# Altium footprint library Pasivos.PcbLib: 55 footprints (part 2 of 4)
Each footprint in its own frame and in the unit in brackets; x right, y up, seen from the top. Pads: shape width x height; smd on the part's side, far side on the other; paste and mask are expansions set on the pad; w line width, h text height; cw(c..) or ccw(c..) is an arc to the next point about the centre after c.
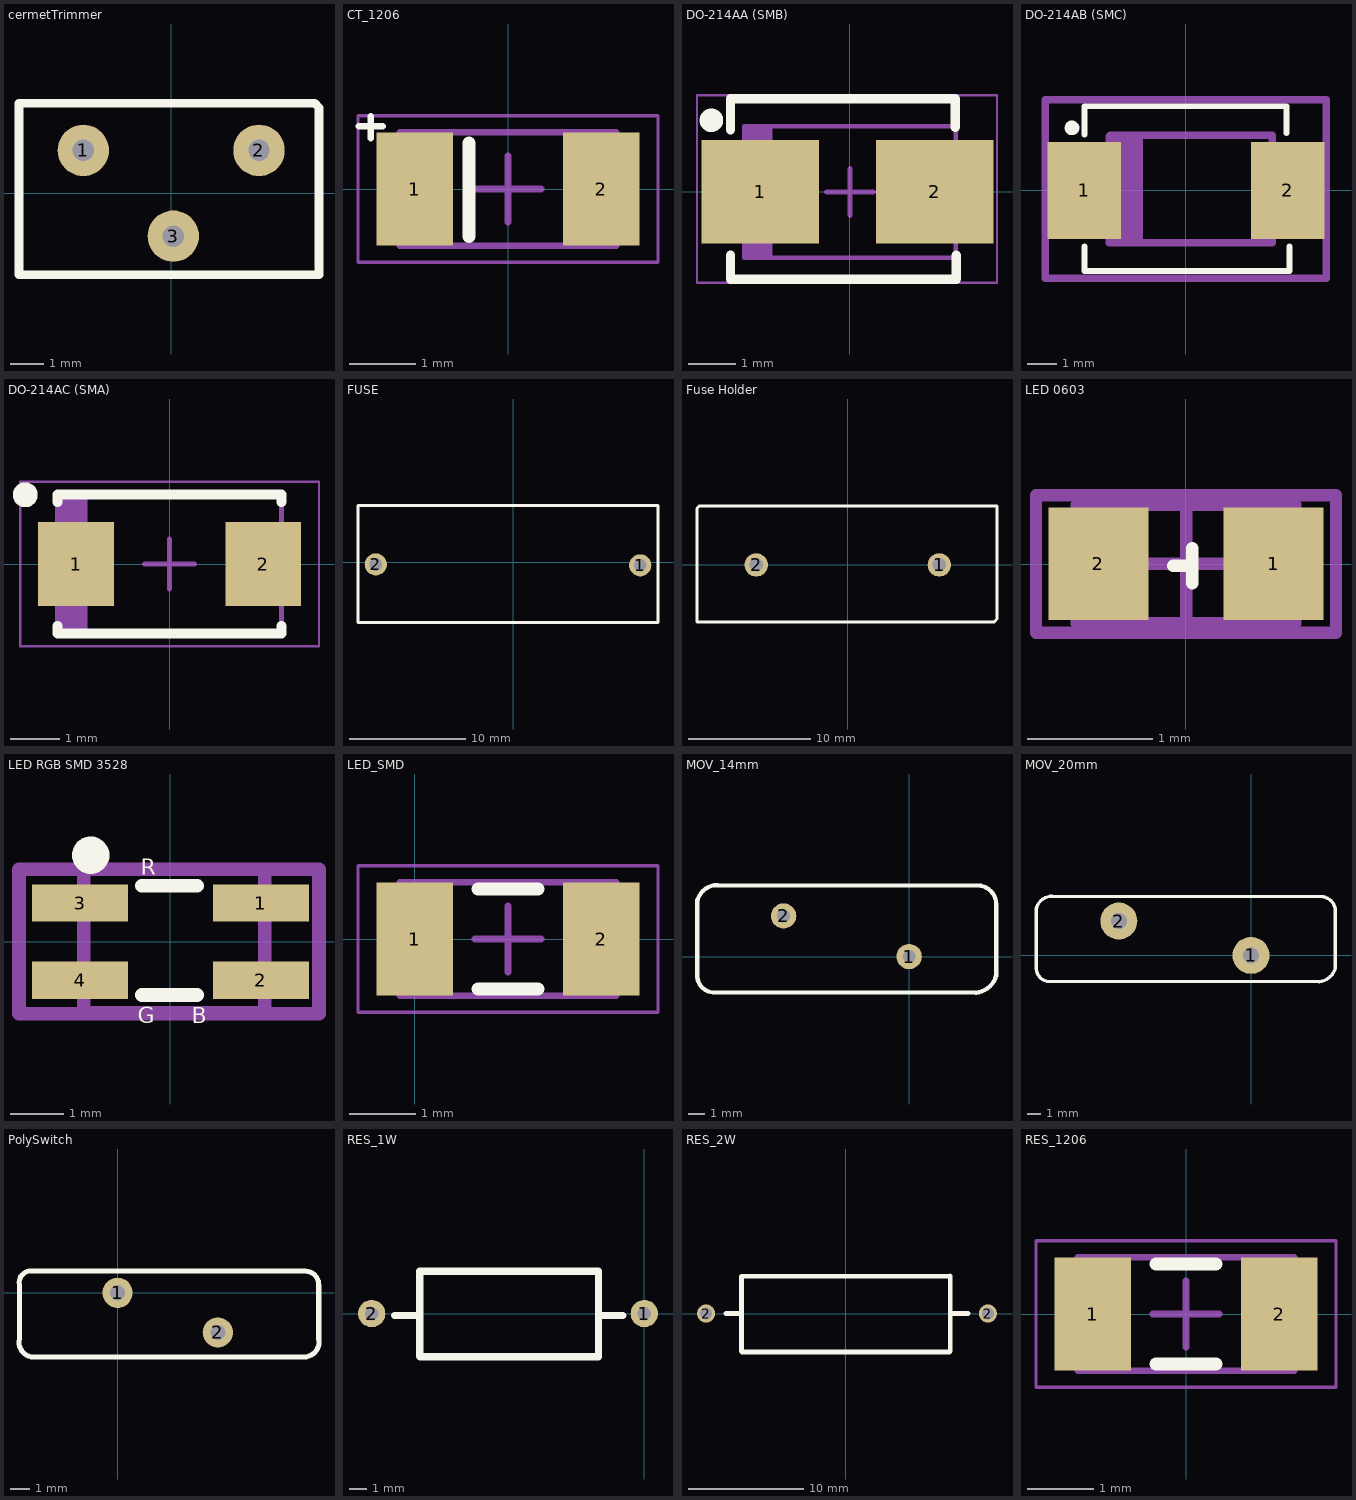
[diagram p1: the footprints below, top view; thin cyan lines are the x and y axes]

## cermetTrimmer [mil] "Bourns 3386H Series Through Hole Cermet Trimmer Resistor with Pin Terminations, 10kO ±10% 1/2W ±100ppm/°C"
pads (3):
  round 60 hole 25: 1(-102.5,50) 2(102.5,50) 3(2.5,-50)
Top Overlay:
  lines w10: -177.5,-95 -177.5,105 167.5,105 172.5,100 172.5,-95 -177.5,-95
3D body: height 380, standoff -231.14, extent -189.5,-90 187.5,105

## CT_1206 [mm] "Tantalum Capacitor 1206 SMD"
height 0.65
pads (2):
  rect 1.15x1.7 smd: 1(-1.4,0) 2(1.4,0)
Top Overlay:
  lines w0.1: -2.235,0.94 -1.88,0.94 ; -2.057,0.762 -2.057,1.092
  lines w0.2: -0.584,-0.711 -0.584,0.686
Mechanical 13:
  lines w0.1: -1.625,-0.85 1.625,-0.85 1.625,0.85 -1.625,0.85 -1.625,-0.85
Mechanical 15:
  lines w0.05: -2.25,-1.1 2.25,-1.1 2.25,1.1 -2.25,1.1 -2.25,-1.1
  lines w0.1: -0.5,0 0.5,0 ; 0,-0.5 0,0.5
3D body: height 1.65, standoff -0.01, extent -1.706,-0.8 1.757,0.8

## DO-214AA (SMB) [mm] "DO-214AA (SMB J-Bend)"
height 2.29
pads (2):
  rect 2.5x2.2 smd: 1(-1.905,0) 2(1.799,0)
Top Overlay:
  circle w0.25: c-2.946,1.524 r0.125
  lines w0.2: -2.54,-1.346 -2.54,-1.854 2.261,-1.854 2.261,-1.346 ; -2.54,1.321 -2.54,1.981 2.235,1.981 2.235,1.372
Mechanical 13:
  rectangle: -2.25,-1.395 -1.645,1.395
  lines w0.1: -2.25,-1.395 -2.25,1.395 2.25,1.395 2.25,-1.395 -2.25,-1.395
Mechanical 15:
  lines w0.05: -3.251,-1.93 -3.251,2.057 3.124,2.057 3.124,-1.93 -3.251,-1.93
  lines w0.1: -0.5,0 0.5,0 ; 0,-0.5 0,0.5
3D body: height 2.6, standoff -0.05, extent -2.921,-1.924 2.667,2.026

## DO-214AB (SMC) [mm] "DO-214AB (SMC) Package"
pads (2):
  rect 2.5x3.3 smd: 1(-3.463,0) 2(3.463,0)
Top Overlay:
  circle w0.25: c-3.886,2.134 r0.125
  lines w0.2: -3.454,-1.905 -3.454,-2.743 3.531,-2.743 3.531,-1.905 ; -3.454,1.905 -3.454,2.87 3.429,2.87 3.429,1.956
Mechanical 13:
  rectangle: -2.616,-1.727 -1.473,1.854
  lines w0.254: -2.616,1.854 -2.616,-1.778 2.946,-1.778 2.946,1.88 -2.591,1.88
Mechanical 15:
  lines w0.254: -4.801,-2.997 4.775,-2.997 4.775,3.099 -4.801,3.099 -4.801,-2.997
3D body: height 2.4, standoff 0.03, extent -4.014,-3.048 4.116,3.052

## DO-214AC (SMA) [mm] "Surface Mount Schottky Barrier Rectifier SS14"
height 2.29
pads (2):
  rect 1.52x1.68 smd: 1(-1.88,0) 2(1.88,0)
Top Overlay:
  circle w0.25: c-2.9,1.39 r0.125
  lines w0.2: -2.25,-1.24 -2.25,-1.4 2.25,-1.4 2.25,-1.24 ; -2.25,1.24 -2.25,1.4 2.25,1.4 2.25,1.24
Mechanical 13:
  rectangle: -2.25,-1.395 -1.645,1.395
  lines w0.1: -2.25,-1.395 2.25,-1.395 2.25,1.395 -2.25,1.395 -2.25,-1.395
Mechanical 15:
  lines w0.05: -3,-1.65 3,-1.65 3,1.65 -3,1.65 -3,-1.65
  lines w0.1: -0.5,0 0.5,0 ; 0,-0.5 0,0.5
3D body: height 2.7, standoff 0, extent -2.825,-1.526 2.775,1.424

## FUSE [mm] "Fuse 5A with Holder 20mm"
pads (2):
  round 1.9 hole 1.1: 1(10.897,-0.254) 2(-11.786,-0.178)
Top Overlay:
  lines w0.254: -13.31,-5.156 12.421,-5.156 12.421,4.877 -13.31,4.877 -13.31,-5.156
3D body: height 13.97, standoff -4.38, extent -12.557,-4.693 11.693,4.307

## Fuse Holder [mm] "PCB Fuse Holder 15mm"
pads (2):
  round 1.924 hole 1.1: 1(7.531,0) 2(-7.531,0)
Top Overlay:
  lines w0.254: -12.395,-4.674 -12.395,4.648 -12.192,4.851 12.268,4.851 12.268,-4.445 12.014,-4.699 -12.37,-4.699
3D body: height 12.5, standoff -3.5, extent -12.237,-4.6 12.163,4.8
3D body: height 12.25, standoff 7.75, extent -9.614,-2.239 9.386,2.261

## LED 0603 [mm] "LED SMD 0603"
height 1.3
pads (2):
  rect 0.8x0.9 smd: 1(0.7,0) 2(-0.7,0)
Top Overlay:
  lines w0.1: -0.102,-0.013 0.051,-0.013 ; 0.051,-0.152 0.051,0.127
Mechanical 13:
  lines w0.1: -0.875,-0.475 0.875,-0.475 0.875,0.475 -0.875,0.475 -0.875,-0.475
Mechanical 15:
  lines w0.1: -0.475,0 0.475,0 ; 0,-0.475 0,0.475 ; -1.2,-0.55 1.2,-0.55 1.2,0.55 -1.2,0.55 -1.2,-0.55
3D body: height 0.68, standoff 0, extent -0.85,-0.344 0.8,0.381

## LED RGB SMD 3528 [mm] "WL-SFTW SMD LED RGB 3528"
pads (4):
  rect 1.8x0.7 smd: 1(1.7,0.725) 2(1.7,-0.725) 3(-1.7,0.725) 4(-1.7,-0.725)
Top Overlay:
  circle w0.5: c-1.499,1.626 r0.1
  lines w0.254: -0.535,-1.002 0.506,-1.002 ; -0.535,1.055 0.506,1.055
  text "G" at -0.611,-1.536 h0.3
  text "R" at -0.561,1.258 h0.3
  text "B" at 0.405,-1.536 h0.3
Mechanical 13:
  lines w0.254: -1.627,-1.332 -1.627,1.284 -1.551,1.36 1.776,1.36 1.776,-1.332 -1.627,-1.332
Mechanical 15:
  lines w0.254: -2.847,-1.358 2.792,-1.358 2.792,1.36 -2.847,1.36 -2.847,-1.358
3D body: height 1.9, standoff 0, extent -1.701,-1.437 1.799,1.363

## LED_SMD [mm] "LED SMD 1206"
pads (2):
  rect 1.15x1.7 smd: 1(0,0) 2(2.8,0)
Top Overlay:
  lines w0.2: 0.95,-0.75 1.85,-0.75 ; 0.95,0.75 1.85,0.75
Mechanical 13:
  lines w0.1: -0.225,-0.85 3.025,-0.85 3.025,0.85 -0.225,0.85 -0.225,-0.85
Mechanical 15:
  lines w0.05: -0.85,-1.1 3.65,-1.1 3.65,1.1 -0.85,1.1 -0.85,-1.1
  lines w0.1: 0.9,0 1.9,0 ; 1.4,-0.5 1.4,0.5
3D body: height 1.1, standoff 0, extent -0.178,-0.787 3.022,0.813

## MOV_14mm [mil] "MOV Varistor Diámetro=14 mm"
pads (2):
  round 60 hole 30: 1(0,0) 2(-297,96)
Top Overlay:
  lines w10: -501,130 cw(c-454.5,121.5) -446,168 ; -501,134 -501,-48 ccw(c-461,-45) -458,-85 163,-85 ; -465,168 163.05,168 ; 158.15,-85.58 ccw(c153,-31) 206,-45 ; 163.05,167.95 cw(c162,124) 205.97,124 ; 206,-46 206,124
3D body: height 787.08, standoff -118.11, extent -481.63,-65 187.63,155.47

## MOV_20mm [mm] "MOV Varistor Diámetro=20 mm"
pads (2):
  round 2.8 hole 1.2: 1(0,0) 2(-10,2.6)
Top Overlay:
  lines w0.254: -16.248,3.489 cw(c-15.067,3.273) -14.851,4.454 ; -16.248,3.591 -16.248,-1.032 ccw(c-15.232,-0.956) -15.156,-1.972 ; -15.309,-1.972 5.189,-1.972 ; -15.207,4.454 5.316,4.454 ; 5.168,-1.987 ccw(c5.037,-0.6) 6.383,-0.956 ; 5.292,4.453 cw(c5.265,3.337) 6.382,3.337 ; 6.383,-0.981 6.383,3.337
3D body: height 24.5, standoff -2.99, extent -15.756,-1.598 5.744,4.2

## PolySwitch [mil] "PolySwitch"
pads (2):
  round 60 hole 30: 1(0,0) 2(198.82,-78.74)
Top Overlay:
  lines w10: -195,-92 ccw(c-166,-98) -172,-127 375,-127 ccw(c369.5,-97.5) 399,-92 399,15 ccw(c372,16) 373,43 -176,43 ccw(c-172,20) -195,16 -195,-92
3D body: height 877.95, standoff -314.96, extent -176.18,-94.72 375,15.98

## RES_1W [mil] "1W THT Resistor"
pads (2):
  round 60 hole 30: 1(0,0) 2(-600,0)
Top Overlay:
  lines w15.75: -550,-4 -496.79,-4 ; -494,93 -494,-94 -493,-95 -101,-95 ; -494,93.17 -101,93.17 ; -101,-94 -101,93 ; -100.56,-4 -47.35,-4
3D body: height 216.54, standoff -98.43, extent -613.78,-98.86 13.78,97.99

## RES_2W [mil] "Wire-Wound Cement Resistor 470 Ohm 2W"
pads (2):
  round 62 hole 40: 2(-476.35,0) 2(484,0)
Top Overlay:
  lines w15.75: -409,0 -355.79,0 ; -355.79,-129.17 -355.79,126.72 ; -355.79,127.17 352.89,127.17 ; -354.35,-131 354.33,-131 ; 355.65,-128.17 355.65,127.72 ; 363.44,0 416.65,0

## RES_1206 [mm] "Chip Resistor, 2-Leads, Body 3,10x1,55mm, IPC Medium Density"
height 0.65
pads (2):
  rect 1.15x1.7 smd: 1(-1.4,0) 2(1.4,0)
Top Overlay:
  lines w0.2: -0.45,-0.75 0.45,-0.75 ; -0.45,0.75 0.45,0.75
Mechanical 13:
  lines w0.1: -1.625,-0.85 -1.625,0.85 1.625,0.85 1.625,-0.85 -1.625,-0.85
Mechanical 15:
  lines w0.05: -2.25,-1.1 -2.25,1.1 2.25,1.1 2.25,-1.1 -2.25,-1.1
  lines w0.1: -0.5,0 0.5,0 ; 0,-0.5 0,0.5
3D body: height 0.55, standoff 0, extent -1.6,-0.8 1.6,0.8